# Altium footprint library Standard2.PcbLib: 423 footprints (part 4 of 27)
Each footprint in its own frame and in the unit in brackets; x right, y up, seen from the top. Pads: shape width x height; smd on the part's side, far side on the other; paste and mask are expansions set on the pad; w line width, h text height; cw(c..) or ccw(c..) is an arc to the next point about the centre after c.
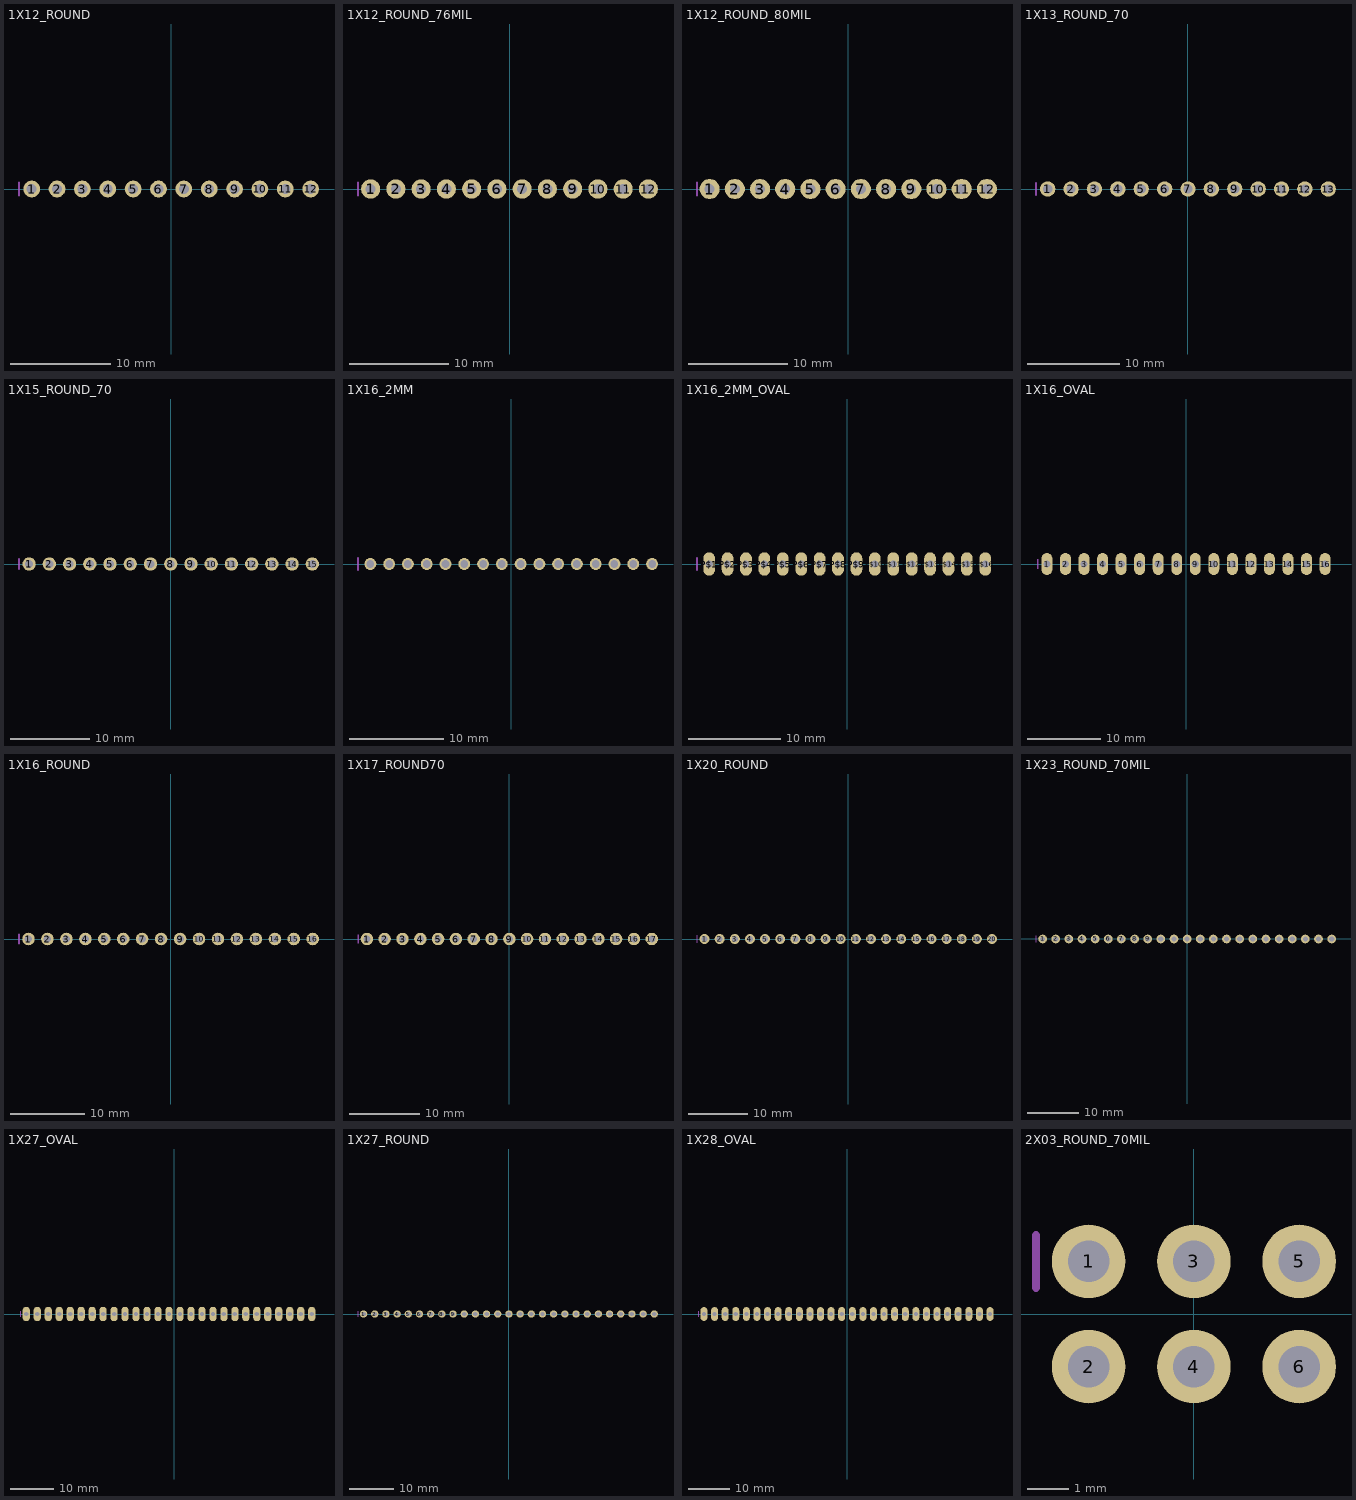
[diagram p3: the footprints below, top view; thin cyan lines are the x and y axes]

## 1X12_ROUND [mil]
pads (12):
  round 66 hole 39.37: 1(-550,0) 2(-450,0) 3(-350,0) 4(-250,0) 5(-150,0) 6(-50,0) 7(50,0) 8(150,0) 9(250,0) 10(350,0) 11(450,0) 12(550,0)
Mechanical 18:
  rectangle: 240,-10 260,10
  rectangle: 140,-10 160,10
  rectangle: 40,-10 60,10
  rectangle: -60,-10 -40,10
  rectangle: -160,-10 -140,10
  rectangle: -260,-10 -240,10
  rectangle: -360,-10 -340,10
  rectangle: -460,-10 -440,10
  rectangle: -560,-10 -540,10
  rectangle: 340,-10 360,10
  rectangle: 440,-10 460,10
  rectangle: 540,-10 560,10
  lines w8: -600,-25 -600,25

## 1X12_ROUND_76MIL [mil]
pads (12):
  round 76 hole 39.37: 1(-550,0) 2(-450,0) 3(-350,0) 4(-250,0) 5(-150,0) 6(-50,0) 7(50,0) 8(150,0) 9(250,0) 10(350,0) 11(450,0) 12(550,0)
Mechanical 18:
  rectangle: 240,-10 260,10
  rectangle: 140,-10 160,10
  rectangle: 40,-10 60,10
  rectangle: -60,-10 -40,10
  rectangle: -160,-10 -140,10
  rectangle: -260,-10 -240,10
  rectangle: -360,-10 -340,10
  rectangle: -460,-10 -440,10
  rectangle: -560,-10 -540,10
  rectangle: 340,-10 360,10
  rectangle: 440,-10 460,10
  rectangle: 540,-10 560,10
  lines w8: -600,-25 -600,25

## 1X12_ROUND_80MIL [mil]
pads (12):
  round 80 hole 39.37: 1(-550,0) 2(-450,0) 3(-350,0) 4(-250,0) 5(-150,0) 6(-50,0) 7(50,0) 8(150,0) 9(250,0) 10(350,0) 11(450,0) 12(550,0)
Mechanical 18:
  rectangle: 240,-10 260,10
  rectangle: 140,-10 160,10
  rectangle: 40,-10 60,10
  rectangle: -60,-10 -40,10
  rectangle: -160,-10 -140,10
  rectangle: -260,-10 -240,10
  rectangle: -360,-10 -340,10
  rectangle: -460,-10 -440,10
  rectangle: -560,-10 -540,10
  rectangle: 340,-10 360,10
  rectangle: 440,-10 460,10
  rectangle: 540,-10 560,10
  lines w8: -600,-25 -600,25

## 1X13_ROUND_70 [mil]
pads (13):
  round 66 hole 39.37: 1(-600,0) 2(-500,0) 3(-400,0) 4(-300,0) 5(-200,0) 6(-100,0) 7(0,0) 8(100,0) 9(200,0) 10(300,0) 11(400,0) 12(500,0) 13(600,0)
Mechanical 18:
  rectangle: 190,-10 210,10
  rectangle: 90,-10 110,10
  rectangle: -10,-10 10,10
  rectangle: -110,-10 -90,10
  rectangle: -210,-10 -190,10
  rectangle: -310,-10 -290,10
  rectangle: -410,-10 -390,10
  rectangle: -510,-10 -490,10
  rectangle: -610,-10 -590,10
  rectangle: 290,-10 310,10
  rectangle: 390,-10 410,10
  rectangle: 490,-10 510,10
  rectangle: 590,-10 610,10
  lines w8: -650,-25 -650,25

## 1X15_ROUND_70 [mil]
pads (15):
  round 66 hole 39.37: 1(-700,0) 2(-600,0) 3(-500,0) 4(-400,0) 5(-300,0) 6(-200,0) 7(-100,0) 8(0,0) 9(100,0) 10(200,0) 11(300,0) 12(400,0) 13(500,0) 14(600,0) 15(700,0)
Mechanical 18:
  rectangle: 90,-10 110,10
  rectangle: -10,-10 10,10
  rectangle: -110,-10 -90,10
  rectangle: -210,-10 -190,10
  rectangle: -310,-10 -290,10
  rectangle: -410,-10 -390,10
  rectangle: -510,-10 -490,10
  rectangle: -610,-10 -590,10
  rectangle: -710,-10 -690,10
  rectangle: 190,-10 210,10
  rectangle: 290,-10 310,10
  rectangle: 390,-10 410,10
  rectangle: 490,-10 510,10
  rectangle: 590,-10 610,10
  rectangle: 690,-10 710,10
  lines w8: -750,-25 -750,25

## 1X16_2MM [mil]
pads (16):
  round 50 hole 31.5: P$1(-590.55,0) P$2(-511.81,0) P$3(-433.07,0) P$4(-354.33,0) P$5(-275.59,0) P$6(-196.85,0) P$7(-118.11,0) P$8(-39.37,0) P$9(39.37,0) P$10(118.11,0) P$11(196.85,0) P$12(275.59,0) P$13(354.33,0) P$14(433.07,0) P$15(511.81,0) P$16(590.55,0)
Mechanical 18:
  rectangle: -600.55,-10 -580.55,10
  rectangle: -521.81,-10 -501.81,10
  rectangle: -443.07,-10 -423.07,10
  rectangle: -364.33,-10 -344.33,10
  rectangle: -285.59,-10 -265.59,10
  rectangle: -206.85,-10 -186.85,10
  rectangle: -128.11,-10 -108.11,10
  rectangle: -49.37,-10 -29.37,10
  rectangle: 29.37,-10 49.37,10
  rectangle: 108.11,-10 128.11,10
  rectangle: 186.85,-10 206.85,10
  rectangle: 265.59,-10 285.59,10
  rectangle: 344.33,-10 364.33,10
  rectangle: 423.07,-10 443.07,10
  rectangle: 501.81,-10 521.81,10
  rectangle: 580.55,-10 600.55,10
  lines w8: -642.52,-25 -642.52,25

## 1X16_2MM_OVAL [mil]
pads (16):
  oval 50x100 hole 31.5: P$1(-590.55,0) P$2(-511.81,0) P$3(-433.07,0) P$4(-354.33,0) P$5(-275.59,0) P$6(-196.85,0) P$7(-118.11,0) P$8(-39.37,0) P$9(39.37,0) P$10(118.11,0) P$11(196.85,0) P$12(275.59,0) P$13(354.33,0) P$14(433.07,0) P$15(511.81,0) P$16(590.55,0)
Mechanical 18:
  rectangle: -600.55,-10 -580.55,10
  rectangle: -521.81,-10 -501.81,10
  rectangle: -443.07,-10 -423.07,10
  rectangle: -364.33,-10 -344.33,10
  rectangle: -285.59,-10 -265.59,10
  rectangle: -206.85,-10 -186.85,10
  rectangle: -128.11,-10 -108.11,10
  rectangle: -49.37,-10 -29.37,10
  rectangle: 29.37,-10 49.37,10
  rectangle: 108.11,-10 128.11,10
  rectangle: 186.85,-10 206.85,10
  rectangle: 265.59,-10 285.59,10
  rectangle: 344.33,-10 364.33,10
  rectangle: 423.07,-10 443.07,10
  rectangle: 501.81,-10 521.81,10
  rectangle: 580.55,-10 600.55,10
  lines w8: -642.52,-25 -642.52,25

## 1X16_OVAL [mm]
pads (16):
  oval 1.5x3 hole 1: 1(-19.05,0) 2(-16.51,0) 3(-13.97,0) 4(-11.43,0) 5(-8.89,0) 6(-6.35,0) 7(-3.81,0) 8(-1.27,0) 9(1.27,0) 10(3.81,0) 11(6.35,0) 12(8.89,0) 13(11.43,0) 14(13.97,0) 15(16.51,0) 16(19.05,0)
Mechanical 18:
  rectangle: 16.256,-0.254 16.764,0.254
  rectangle: 13.716,-0.254 14.224,0.254
  rectangle: 11.176,-0.254 11.684,0.254
  rectangle: 8.636,-0.254 9.144,0.254
  rectangle: 6.096,-0.254 6.604,0.254
  rectangle: 3.556,-0.254 4.064,0.254
  rectangle: 1.016,-0.254 1.524,0.254
  rectangle: -1.524,-0.254 -1.016,0.254
  rectangle: -4.064,-0.254 -3.556,0.254
  rectangle: -6.604,-0.254 -6.096,0.254
  rectangle: -9.144,-0.254 -8.636,0.254
  rectangle: -11.684,-0.254 -11.176,0.254
  rectangle: -14.224,-0.254 -13.716,0.254
  rectangle: -16.764,-0.254 -16.256,0.254
  rectangle: -19.304,-0.254 -18.796,0.254
  rectangle: 18.796,-0.254 19.304,0.254
  lines w0.203: -20.32,-0.635 -20.32,0.635

## 1X16_ROUND [mil]
pads (16):
  round 66 hole 39.37: 1(-750,0) 2(-650,0) 3(-550,0) 4(-450,0) 5(-350,0) 6(-250,0) 7(-150,0) 8(-50,0) 9(50,0) 10(150,0) 11(250,0) 12(350,0) 13(450,0) 14(550,0) 15(650,0) 16(750,0)
Mechanical 18:
  rectangle: 640,-10 660,10
  rectangle: 540,-10 560,10
  rectangle: 440,-10 460,10
  rectangle: 340,-10 360,10
  rectangle: 240,-10 260,10
  rectangle: 140,-10 160,10
  rectangle: 40,-10 60,10
  rectangle: -60,-10 -40,10
  rectangle: -160,-10 -140,10
  rectangle: -260,-10 -240,10
  rectangle: -360,-10 -340,10
  rectangle: -460,-10 -440,10
  rectangle: -560,-10 -540,10
  rectangle: -660,-10 -640,10
  rectangle: -760,-10 -740,10
  rectangle: 740,-10 760,10
  lines w8: -800,-25 -800,25

## 1X17_ROUND70 [mil]
pads (17):
  round 70 hole 39.37: 1(-800,0) 2(-700,0) 3(-600,0) 4(-500,0) 5(-400,0) 6(-300,0) 7(-200,0) 8(-100,0) 9(0,0) 10(100,0) 11(200,0) 12(300,0) 13(400,0) 14(500,0) 15(600,0) 16(700,0) 17(800,0)
Mechanical 18:
  rectangle: -10,-10 10,10
  rectangle: -110,-10 -90,10
  rectangle: -210,-10 -190,10
  rectangle: -310,-10 -290,10
  rectangle: -410,-10 -390,10
  rectangle: -510,-10 -490,10
  rectangle: -610,-10 -590,10
  rectangle: -710,-10 -690,10
  rectangle: -810,-10 -790,10
  rectangle: 90,-10 110,10
  rectangle: 190,-10 210,10
  rectangle: 290,-10 310,10
  rectangle: 390,-10 410,10
  rectangle: 490,-10 510,10
  rectangle: 590,-10 610,10
  rectangle: 690,-10 710,10
  rectangle: 790,-10 810,10
  lines w8: -850,-25 -850,25

## 1X20_ROUND [mil]
pads (20):
  round 66 hole 39.37: 1(-950,0) 2(-850,0) 3(-750,0) 4(-650,0) 5(-550,0) 6(-450,0) 7(-350,0) 8(-250,0) 9(-150,0) 10(-50,0) 11(50,0) 12(150,0) 13(250,0) 14(350,0) 15(450,0) 16(550,0) 17(650,0) 18(750,0) 19(850,0) 20(950,0)
Mechanical 18:
  rectangle: 440,-10 460,10
  rectangle: 340,-10 360,10
  rectangle: 240,-10 260,10
  rectangle: 140,-10 160,10
  rectangle: 40,-10 60,10
  rectangle: -60,-10 -40,10
  rectangle: -160,-10 -140,10
  rectangle: -260,-10 -240,10
  rectangle: -360,-10 -340,10
  rectangle: -460,-10 -440,10
  rectangle: -560,-10 -540,10
  rectangle: -660,-10 -640,10
  rectangle: -760,-10 -740,10
  rectangle: -860,-10 -840,10
  rectangle: -960,-10 -940,10
  rectangle: 540,-10 560,10
  rectangle: 640,-10 660,10
  rectangle: 740,-10 760,10
  rectangle: 840,-10 860,10
  rectangle: 940,-10 960,10
  lines w8: -1000,-25 -1000,25

## 1X23_ROUND_70MIL [mil]
pads (23):
  round 66 hole 39.37: 1(-1100,0) 2(-1000,0) 3(-900,0) 4(-800,0) 5(-700,0) 6(-600,0) 7(-500,0) 8(-400,0) 9(-300,0) 10(-200,0) 11(-100,0) 12(0,0) 13(100,0) 14(200,0) 15(300,0) 16(400,0) 17(500,0) 18(600,0) 19(700,0) 20(800,0) 21(900,0) 22(1000,0) 23(1100,0)
Mechanical 18:
  rectangle: 290,-10 310,10
  rectangle: 190,-10 210,10
  rectangle: 90,-10 110,10
  rectangle: -10,-10 10,10
  rectangle: -110,-10 -90,10
  rectangle: -210,-10 -190,10
  rectangle: -310,-10 -290,10
  rectangle: -410,-10 -390,10
  rectangle: -510,-10 -490,10
  rectangle: -610,-10 -590,10
  rectangle: -710,-10 -690,10
  rectangle: -810,-10 -790,10
  rectangle: -910,-10 -890,10
  rectangle: -1010,-10 -990,10
  rectangle: -1110,-10 -1090,10
  rectangle: 390,-10 410,10
  rectangle: 490,-10 510,10
  rectangle: 590,-10 610,10
  rectangle: 690,-10 710,10
  rectangle: 790,-10 810,10
  rectangle: 890,-10 910,10
  rectangle: 990,-10 1010,10
  rectangle: 1090,-10 1110,10
  lines w8: -1150,-25 -1150,25

## 1X27_OVAL [mil]
pads (27):
  oval 66x132 hole 39.37: 1(-1350,0) 2(-1250,0) 3(-1150,0) 4(-1050,0) 5(-950,0) 6(-850,0) 7(-750,0) 8(-650,0) 9(-550,0) 10(-450,0) 11(-350,0) 12(-250,0) 13(-150,0) 14(-50,0) 15(50,0) 16(150,0) 17(250,0) 18(350,0) 19(450,0) 20(550,0) 21(650,0) 22(750,0) 23(850,0) 24(950,0) 25(1050,0) 26(1150,0) 27(1250,0)
Mechanical 18:
  rectangle: -560,-10 -540,10
  rectangle: -660,-10 -640,10
  rectangle: -760,-10 -740,10
  rectangle: -860,-10 -840,10
  rectangle: -960,-10 -940,10
  rectangle: -1060,-10 -1040,10
  rectangle: -1160,-10 -1140,10
  rectangle: -1260,-10 -1240,10
  rectangle: -1360,-10 -1340,10
  rectangle: -460,-10 -440,10
  rectangle: -360,-10 -340,10
  rectangle: -260,-10 -240,10
  rectangle: -160,-10 -140,10
  rectangle: -60,-10 -40,10
  rectangle: 40,-10 60,10
  rectangle: 140,-10 160,10
  rectangle: 240,-10 260,10
  rectangle: 340,-10 360,10
  rectangle: 440,-10 460,10
  rectangle: 540,-10 560,10
  rectangle: 640,-10 660,10
  rectangle: 740,-10 760,10
  rectangle: 840,-10 860,10
  rectangle: 940,-10 960,10
  rectangle: 1040,-10 1060,10
  rectangle: 1140,-10 1160,10
  rectangle: 1240,-10 1260,10
  lines w8: -1400,-25 -1400,25

## 1X27_ROUND [mil]
pads (27):
  round 66 hole 39.37: 1(-1300,0) 2(-1200,0) 3(-1100,0) 4(-1000,0) 5(-900,0) 6(-800,0) 7(-700,0) 8(-600,0) 9(-500,0) 10(-400,0) 11(-300,0) 12(-200,0) 13(-100,0) 14(0,0) 15(100,0) 16(200,0) 17(300,0) 18(400,0) 19(500,0) 20(600,0) 21(700,0) 22(800,0) 23(900,0) 24(1000,0) 25(1100,0) 26(1200,0) 27(1300,0)
Mechanical 18:
  rectangle: -510,-10 -490,10
  rectangle: -610,-10 -590,10
  rectangle: -710,-10 -690,10
  rectangle: -810,-10 -790,10
  rectangle: -910,-10 -890,10
  rectangle: -1010,-10 -990,10
  rectangle: -1110,-10 -1090,10
  rectangle: -1210,-10 -1190,10
  rectangle: -1310,-10 -1290,10
  rectangle: -410,-10 -390,10
  rectangle: -310,-10 -290,10
  rectangle: -210,-10 -190,10
  rectangle: -110,-10 -90,10
  rectangle: -10,-10 10,10
  rectangle: 90,-10 110,10
  rectangle: 190,-10 210,10
  rectangle: 290,-10 310,10
  rectangle: 390,-10 410,10
  rectangle: 490,-10 510,10
  rectangle: 590,-10 610,10
  rectangle: 690,-10 710,10
  rectangle: 790,-10 810,10
  rectangle: 890,-10 910,10
  rectangle: 990,-10 1010,10
  rectangle: 1090,-10 1110,10
  rectangle: 1190,-10 1210,10
  rectangle: 1290,-10 1310,10
  lines w8: -1350,-25 -1350,25

## 1X28_OVAL [mil]
pads (28):
  oval 66x132 hole 39.37: 1(-1350,0) 2(-1250,0) 3(-1150,0) 4(-1050,0) 5(-950,0) 6(-850,0) 7(-750,0) 8(-650,0) 9(-550,0) 10(-450,0) 11(-350,0) 12(-250,0) 13(-150,0) 14(-50,0) 15(50,0) 16(150,0) 17(250,0) 18(350,0) 19(450,0) 20(550,0) 21(650,0) 22(750,0) 23(850,0) 24(950,0) 25(1050,0) 26(1150,0) 27(1250,0) 28(1350,0)
Mechanical 18:
  rectangle: 1340,-10 1360,10
  rectangle: 1240,-10 1260,10
  rectangle: 1140,-10 1160,10
  rectangle: 1040,-10 1060,10
  rectangle: 940,-10 960,10
  rectangle: 840,-10 860,10
  rectangle: 740,-10 760,10
  rectangle: 640,-10 660,10
  rectangle: 540,-10 560,10
  rectangle: 440,-10 460,10
  rectangle: 340,-10 360,10
  rectangle: 240,-10 260,10
  rectangle: 140,-10 160,10
  rectangle: 40,-10 60,10
  rectangle: -60,-10 -40,10
  rectangle: -160,-10 -140,10
  rectangle: -260,-10 -240,10
  rectangle: -360,-10 -340,10
  rectangle: -460,-10 -440,10
  rectangle: -1360,-10 -1340,10
  rectangle: -1260,-10 -1240,10
  rectangle: -1160,-10 -1140,10
  rectangle: -1060,-10 -1040,10
  rectangle: -960,-10 -940,10
  rectangle: -860,-10 -840,10
  rectangle: -760,-10 -740,10
  rectangle: -660,-10 -640,10
  rectangle: -560,-10 -540,10
  lines w8: -1400,-25 -1400,25

## 2X03_ROUND_70MIL [mil]
pads (6):
  round 70 hole 39.37: 1(-100,50) 2(-100,-50) 3(0,50) 4(0,-50) 5(100,50) 6(100,-50)
Mechanical 18:
  rectangle: -10,-60 10,-40
  rectangle: -110,-60 -90,-40
  rectangle: 90,40 110,60
  rectangle: -10,40 10,60
  rectangle: -110,40 -90,60
  rectangle: 90,-60 110,-40
  lines w8: -150,25 -150,75